# Altium footprint library ref-packages-longpad.PCBLIB: 1527 footprints (part 57 of 103)
Each footprint in its own frame and in the unit in brackets; x right, y up, seen from the top. Pads: shape width x height; smd on the part's side, far side on the other; paste and mask are expansions set on the pad; w line width, h text height; cw(c..) or ccw(c..) is an arc to the next point about the centre after c.
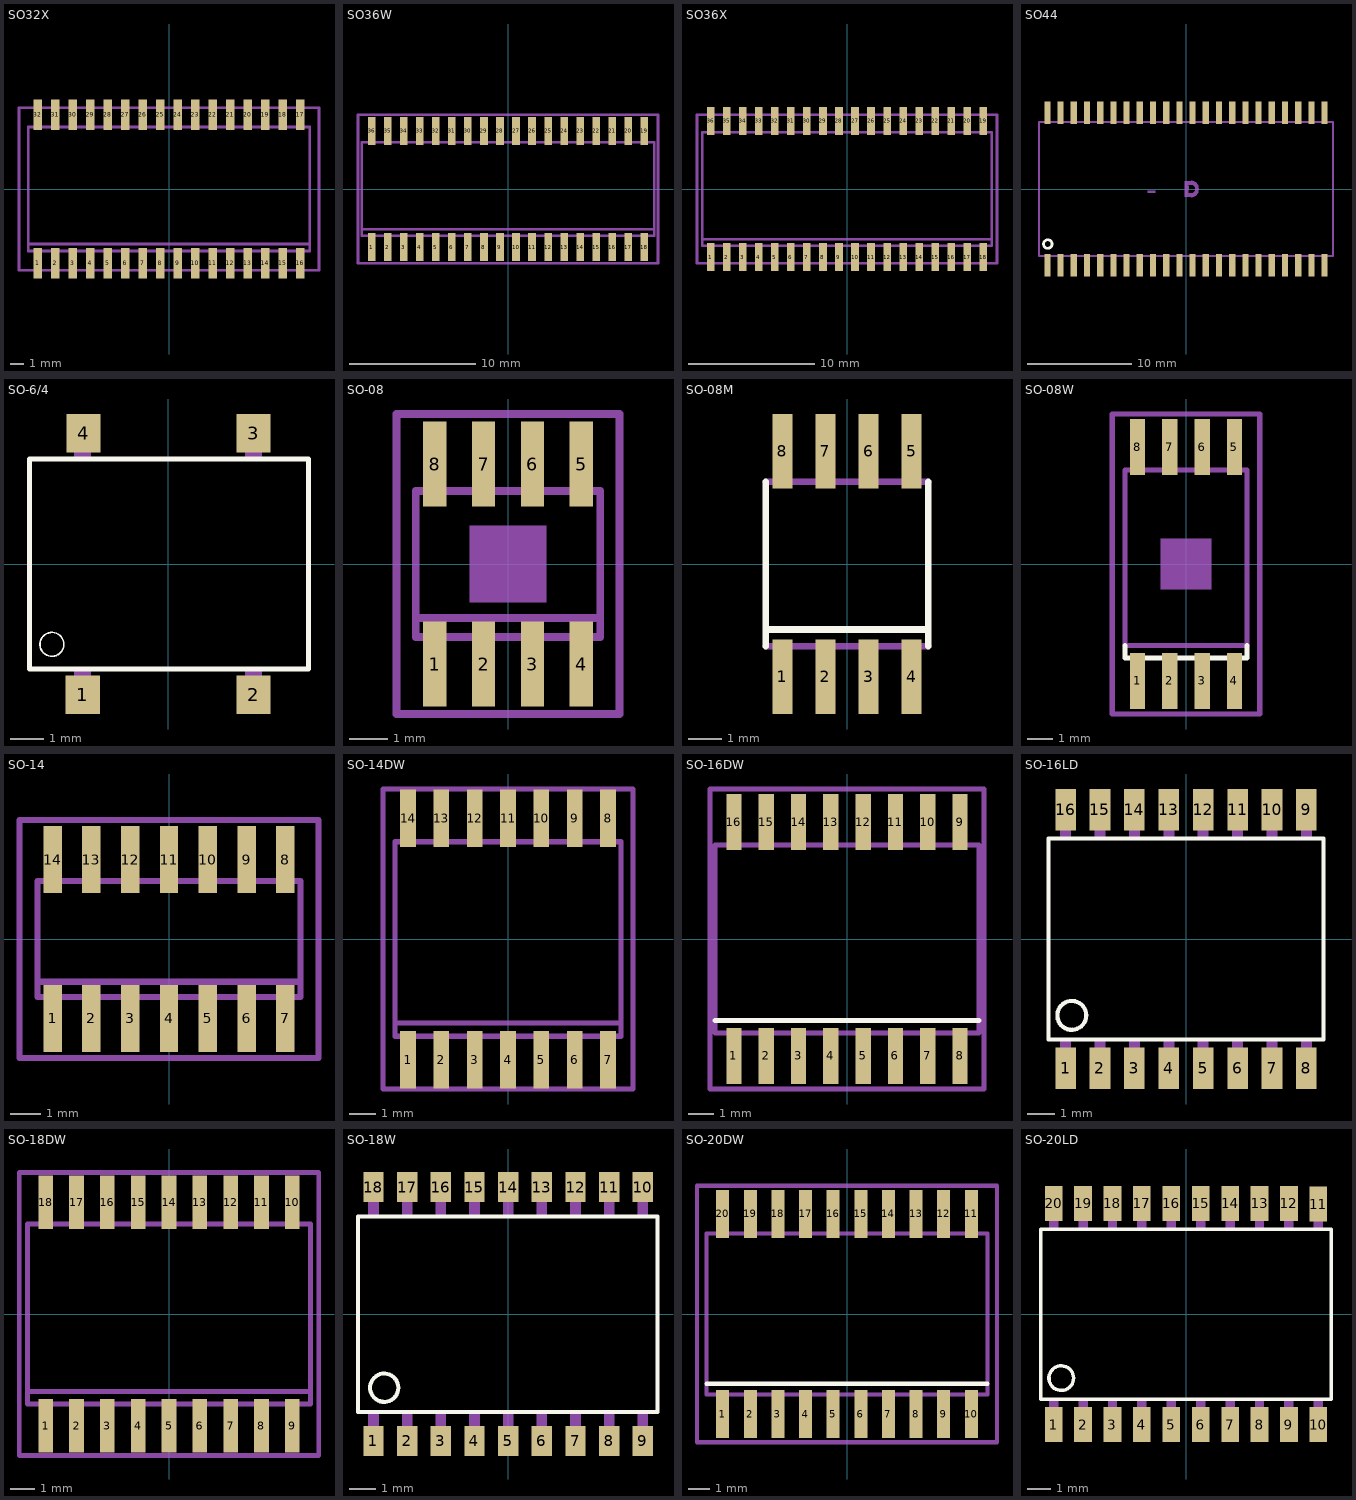
[diagram p56: the footprints below, top view; thin cyan lines are the x and y axes]

## SO32X [mil]
pads (32):
  rect 23.62x86.61 smd: 1(-375,-212.6) 2(-325,-212.6) 3(-275,-212.6) 4(-225,-212.6) 5(-175,-212.6) 6(-125,-212.6) 7(-75,-212.6) 8(-25,-212.6) 9(25,-212.6) 10(75,-212.6) 11(125,-212.6) 12(175,-212.6) 13(225,-212.6) 14(275,-212.6) 15(325,-212.6) 16(375,-212.6) 17(375,212.6) 18(325,212.6) 19(275,212.6) 20(225,212.6) 21(175,212.6) 22(125,212.6) 23(75,212.6) 24(25,212.6) 25(-25,212.6) 26(-75,212.6) 27(-125,212.6) 28(-175,212.6) 29(-225,212.6) 30(-275,212.6) 31(-325,212.6) 32(-375,212.6)
Mechanical 16:
  rectangle: -384.65,-240.94 -365.35,-181.1
  rectangle: -334.65,-240.94 -315.35,-181.1
  rectangle: -284.65,-240.94 -265.35,-181.1
  rectangle: -234.65,-240.94 -215.35,-181.1
  rectangle: -184.65,-240.94 -165.35,-181.1
  rectangle: -134.65,-240.94 -115.35,-181.1
  rectangle: -84.65,-240.94 -65.35,-181.1
  rectangle: -34.65,-240.94 -15.35,-181.1
  rectangle: 15.35,-240.94 34.65,-181.1
  rectangle: 65.35,-240.94 84.65,-181.1
  rectangle: 115.35,-240.94 134.65,-181.1
  rectangle: 165.35,-240.94 184.65,-181.1
  rectangle: 215.35,-240.94 234.65,-181.1
  rectangle: 265.35,-240.94 284.65,-181.1
  rectangle: 315.35,-240.94 334.65,-181.1
  rectangle: 365.35,-240.94 384.65,-181.1
  rectangle: 365.35,181.1 384.65,240.94
  rectangle: 315.35,181.1 334.65,240.94
  rectangle: 265.35,181.1 284.65,240.94
  rectangle: 215.35,181.1 234.65,240.94
  rectangle: 165.35,181.1 184.65,240.94
  rectangle: 115.35,181.1 134.65,240.94
  rectangle: 65.35,181.1 84.65,240.94
  rectangle: 15.35,181.1 34.65,240.94
  rectangle: -34.65,181.1 -15.35,240.94
  rectangle: -84.65,181.1 -65.35,240.94
  rectangle: -134.65,181.1 -115.35,240.94
  rectangle: -184.65,181.1 -165.35,240.94
  rectangle: -234.65,181.1 -215.35,240.94
  rectangle: -284.65,181.1 -265.35,240.94
  rectangle: -334.65,181.1 -315.35,240.94
  rectangle: -384.65,181.1 -365.35,240.94
  lines w8: -402.36,-157.48 -402.36,-177.17 402.36,-177.17 402.36,-157.48 ; -402.36,-157.48 -402.36,177.17 402.36,177.17 402.36,-157.48 ; -402.36,-157.48 402.36,-157.48
Mechanical 27:
  lines w7.87: -428.94,-232.28 428.94,-232.28 428.94,232.28 -428.94,232.28 -428.94,-232.28

## SO36W [mil]
pads (36):
  rect 23.62x86.61 smd: 1(-425,-181.1) 2(-375,-181.1) 3(-325,-181.1) 4(-275,-181.1) 5(-225,-181.1) 6(-175,-181.1) 7(-125,-181.1) 8(-75,-181.1) 9(-25,-181.1) 10(25,-181.1) 11(75,-181.1) 12(125,-181.1) 13(175,-181.1) 14(225,-181.1) 15(275,-181.1) 16(325,-181.1) 17(375,-181.1) 18(425,-181.1) 19(425,181.1) 20(375,181.1) 21(325,181.1) 22(275,181.1) 23(225,181.1) 24(175,181.1) 25(125,181.1) 26(75,181.1) 27(25,181.1) 28(-25,181.1) 29(-75,181.1) 30(-125,181.1) 31(-175,181.1) 32(-225,181.1) 33(-275,181.1) 34(-325,181.1) 35(-375,181.1) 36(-425,181.1)
Mechanical 16:
  rectangle: -434.65,-209.45 -415.35,-149.61
  rectangle: -384.65,-209.45 -365.35,-149.61
  rectangle: -334.65,-209.45 -315.35,-149.61
  rectangle: -284.65,-209.45 -265.35,-149.61
  rectangle: -234.65,-209.45 -215.35,-149.61
  rectangle: -184.65,-209.45 -165.35,-149.61
  rectangle: -134.65,-209.45 -115.35,-149.61
  rectangle: -84.65,-209.45 -65.35,-149.61
  rectangle: -34.65,-209.45 -15.35,-149.61
  rectangle: 15.35,-209.45 34.65,-149.61
  rectangle: 65.35,-209.45 84.65,-149.61
  rectangle: 115.35,-209.45 134.65,-149.61
  rectangle: 165.35,-209.45 184.65,-149.61
  rectangle: 215.35,-209.45 234.65,-149.61
  rectangle: 265.35,-209.45 284.65,-149.61
  rectangle: 315.35,-209.45 334.65,-149.61
  rectangle: 365.35,-209.45 384.65,-149.61
  rectangle: 415.35,-209.45 434.65,-149.61
  rectangle: 415.35,149.61 434.65,209.45
  rectangle: 365.35,149.61 384.65,209.45
  rectangle: 315.35,149.61 334.65,209.45
  rectangle: 265.35,149.61 284.65,209.45
  rectangle: 215.35,149.61 234.65,209.45
  rectangle: 165.35,149.61 184.65,209.45
  rectangle: 115.35,149.61 134.65,209.45
  rectangle: 65.35,149.61 84.65,209.45
  rectangle: 15.35,149.61 34.65,209.45
  rectangle: -34.65,149.61 -15.35,209.45
  rectangle: -84.65,149.61 -65.35,209.45
  rectangle: -134.65,149.61 -115.35,209.45
  rectangle: -184.65,149.61 -165.35,209.45
  rectangle: -234.65,149.61 -215.35,209.45
  rectangle: -284.65,149.61 -265.35,209.45
  rectangle: -334.65,149.61 -315.35,209.45
  rectangle: -384.65,149.61 -365.35,209.45
  rectangle: -434.65,149.61 -415.35,209.45
  lines w8: -456.3,-125.98 -456.3,-145.67 456.3,-145.67 456.3,-125.98 ; -456.3,-125.98 -456.3,145.67 456.3,145.67 456.3,-125.98 ; -456.3,-125.98 456.3,-125.98
Mechanical 27:
  lines w7.87: -468.31,-232.28 468.31,-232.28 468.31,232.28 -468.31,232.28 -468.31,-232.28

## SO36X [mil]
pads (36):
  rect 23.62x86.61 smd: 1(-425,-212.6) 2(-375,-212.6) 3(-325,-212.6) 4(-275,-212.6) 5(-225,-212.6) 6(-175,-212.6) 7(-125,-212.6) 8(-75,-212.6) 9(-25,-212.6) 10(25,-212.6) 11(75,-212.6) 12(125,-212.6) 13(175,-212.6) 14(225,-212.6) 15(275,-212.6) 16(325,-212.6) 17(375,-212.6) 18(425,-212.6) 19(425,212.6) 20(375,212.6) 21(325,212.6) 22(275,212.6) 23(225,212.6) 24(175,212.6) 25(125,212.6) 26(75,212.6) 27(25,212.6) 28(-25,212.6) 29(-75,212.6) 30(-125,212.6) 31(-175,212.6) 32(-225,212.6) 33(-275,212.6) 34(-325,212.6) 35(-375,212.6) 36(-425,212.6)
Mechanical 16:
  rectangle: -434.65,-240.94 -415.35,-181.1
  rectangle: -384.65,-240.94 -365.35,-181.1
  rectangle: -334.65,-240.94 -315.35,-181.1
  rectangle: -284.65,-240.94 -265.35,-181.1
  rectangle: -234.65,-240.94 -215.35,-181.1
  rectangle: -184.65,-240.94 -165.35,-181.1
  rectangle: -134.65,-240.94 -115.35,-181.1
  rectangle: -84.65,-240.94 -65.35,-181.1
  rectangle: -34.65,-240.94 -15.35,-181.1
  rectangle: 15.35,-240.94 34.65,-181.1
  rectangle: 65.35,-240.94 84.65,-181.1
  rectangle: 115.35,-240.94 134.65,-181.1
  rectangle: 165.35,-240.94 184.65,-181.1
  rectangle: 215.35,-240.94 234.65,-181.1
  rectangle: 265.35,-240.94 284.65,-181.1
  rectangle: 315.35,-240.94 334.65,-181.1
  rectangle: 365.35,-240.94 384.65,-181.1
  rectangle: 415.35,-240.94 434.65,-181.1
  rectangle: 415.35,181.1 434.65,240.94
  rectangle: 365.35,181.1 384.65,240.94
  rectangle: 315.35,181.1 334.65,240.94
  rectangle: 265.35,181.1 284.65,240.94
  rectangle: 215.35,181.1 234.65,240.94
  rectangle: 165.35,181.1 184.65,240.94
  rectangle: 115.35,181.1 134.65,240.94
  rectangle: 65.35,181.1 84.65,240.94
  rectangle: 15.35,181.1 34.65,240.94
  rectangle: -34.65,181.1 -15.35,240.94
  rectangle: -84.65,181.1 -65.35,240.94
  rectangle: -134.65,181.1 -115.35,240.94
  rectangle: -184.65,181.1 -165.35,240.94
  rectangle: -234.65,181.1 -215.35,240.94
  rectangle: -284.65,181.1 -265.35,240.94
  rectangle: -334.65,181.1 -315.35,240.94
  rectangle: -384.65,181.1 -365.35,240.94
  rectangle: -434.65,181.1 -415.35,240.94
  lines w8: -452.36,-157.48 -452.36,-177.17 452.36,-177.17 452.36,-157.48 ; -452.36,-157.48 -452.36,177.17 452.36,177.17 452.36,-157.48 ; -452.36,-157.48 452.36,-157.48
Mechanical 27:
  lines w7.87: -468.31,-232.28 468.31,-232.28 468.31,232.28 -468.31,232.28 -468.31,-232.28

## SO44 [mil]
pads (44):
  rect 23.62x86.61 smd: 1(-525,-288.98) 2(-475,-288.98) 3(-425,-288.98) 4(-375,-288.98) 5(-325,-288.98) 6(-275,-288.98) 7(-225,-288.98) 8(-175,-288.98) 9(-125,-288.98) 10(-75,-288.98) 11(-25,-288.98) 12(25,-288.98) 13(75,-288.98) 14(125,-288.98) 15(175,-288.98) 16(225,-288.98) 17(275,-288.98) 18(325,-288.98) 19(375,-288.98) 20(425,-288.98) 21(475,-288.98) 22(525,-288.98) 23(525,288.98) 24(475,288.98) 25(425,288.98) 26(375,288.98) 27(325,288.98) 28(275,288.98) 29(225,288.98) 30(175,288.98) 31(125,288.98) 32(75,288.98) 33(25,288.98) 34(-25,288.98) 35(-75,288.98) 36(-125,288.98) 37(-175,288.98) 38(-225,288.98) 39(-275,288.98) 40(-325,288.98) 41(-375,288.98) 42(-425,288.98) 43(-475,288.98) 44(-525,288.98)
Top Overlay:
  circle w10: c-523.62,-208.66 r16.23
Mechanical 16:
  rectangle: -534.65,-317.32 -515.35,-257.48
  rectangle: -484.65,-317.32 -465.35,-257.48
  rectangle: -434.65,-317.32 -415.35,-257.48
  rectangle: -384.65,-317.32 -365.35,-257.48
  rectangle: -334.65,-317.32 -315.35,-257.48
  rectangle: -284.65,-317.32 -265.35,-257.48
  rectangle: -234.65,-317.32 -215.35,-257.48
  rectangle: -184.65,-317.32 -165.35,-257.48
  rectangle: -134.65,-317.32 -115.35,-257.48
  rectangle: -84.65,-317.32 -65.35,-257.48
  rectangle: -34.65,-317.32 -15.35,-257.48
  rectangle: 15.35,-317.32 34.65,-257.48
  rectangle: 65.35,-317.32 84.65,-257.48
  rectangle: 115.35,-317.32 134.65,-257.48
  rectangle: 165.35,-317.32 184.65,-257.48
  rectangle: 215.35,-317.32 234.65,-257.48
  rectangle: 265.35,-317.32 284.65,-257.48
  rectangle: 315.35,-317.32 334.65,-257.48
  rectangle: 365.35,-317.32 384.65,-257.48
  rectangle: 415.35,-317.32 434.65,-257.48
  rectangle: 465.35,-317.32 484.65,-257.48
  rectangle: 515.35,-317.32 534.65,-257.48
  rectangle: 515.35,257.48 534.65,317.32
  rectangle: 465.35,257.48 484.65,317.32
  rectangle: 415.35,257.48 434.65,317.32
  rectangle: 365.35,257.48 384.65,317.32
  rectangle: 315.35,257.48 334.65,317.32
  rectangle: 265.35,257.48 284.65,317.32
  rectangle: 215.35,257.48 234.65,317.32
  rectangle: 165.35,257.48 184.65,317.32
  rectangle: 115.35,257.48 134.65,317.32
  rectangle: 65.35,257.48 84.65,317.32
  rectangle: 15.35,257.48 34.65,317.32
  rectangle: -34.65,257.48 -15.35,317.32
  rectangle: -84.65,257.48 -65.35,317.32
  rectangle: -134.65,257.48 -115.35,317.32
  rectangle: -184.65,257.48 -165.35,317.32
  rectangle: -234.65,257.48 -215.35,317.32
  rectangle: -284.65,257.48 -265.35,317.32
  rectangle: -334.65,257.48 -315.35,317.32
  rectangle: -384.65,257.48 -365.35,317.32
  rectangle: -434.65,257.48 -415.35,317.32
  rectangle: -484.65,257.48 -465.35,317.32
  rectangle: -534.65,257.48 -515.35,317.32
  rectangle: -2,16 20,30
  rectangle: -2,-30 20,-16
  rectangle: -145,-15 -115,-5
  rectangle: -5,-30 10,30
  region: 0,0 10,0 10,10 0,10
  region: 0,0 10,0 10,10 0,10
  region: 0,0 10,0 10,10 0,10
  region: 0,0 10,0 10,10 0,10
  lines w2: 19,-29 ccw(c19,0) 19,29
  lines w8: 19,-25 ccw(c19,0) 19,25 ; -556.3,-253.54 556.3,-253.54 556.3,253.54 -556.3,253.54 -556.3,-253.54
  lines w10: 19,-21 ccw(c19,0) 19,21

## SO-6/4 [mil]
pads (4):
  rect 40x45 smd: 1(-100,-153) 2(100,-153) 3(100,153) 4(-99,153)
Top Overlay:
  circle w2: c-136,-94 r14
  lines w6: -162,-123 164,-123 164,123 -162,123 -162,-123
Mechanical 16:
  rectangle: -110,-159 -90,-125
  rectangle: 90,-159 110,-125
  rectangle: 90,125 110,159
  rectangle: -110,125 -90,159

## SO-08 [mil]
pads (8):
  rect 23.62x86.61 smd: 1(-75,-102.36) 2(-25,-102.36) 3(25,-102.36) 4(75,-102.36) 5(75,102.36) 6(25,102.36) 7(-25,102.36) 8(-75,102.36)
Mechanical 6:
  rectangle: -39.37,-39.37 39.37,39.37
Mechanical 13:
  text "IPC SO8" at -75,-25 h24.8
  text "JEDEC MS-012 AA" at -75,14.37 h18.6
Mechanical 16:
  rectangle: -84.65,-122.05 -65.35,-78.74
  rectangle: -34.65,-122.05 -15.35,-78.74
  rectangle: 15.35,-122.05 34.65,-78.74
  rectangle: 65.35,-122.05 84.65,-78.74
  rectangle: 65.35,78.74 84.65,122.05
  rectangle: 15.35,78.74 34.65,122.05
  rectangle: -34.65,78.74 -15.35,122.05
  rectangle: -84.65,78.74 -65.35,122.05
  lines w8: -94.49,-55.12 -94.49,-74.8 94.49,-74.8 94.49,-55.12 ; -94.49,-55.12 -94.49,74.8 94.49,74.8 94.49,-55.12 ; -94.49,-55.12 94.49,-55.12
Mechanical 27:
  lines w7.87: -114.17,-153.54 114.17,-153.54 114.17,153.54 -114.17,153.54 -114.17,-153.54

## SO-08M [mil]
pads (8):
  rect 23.62x86.61 smd: 1(-75,-131.1) 2(-25,-131.1) 3(25,-131.1) 4(75,-131.1) 5(75,131.1) 6(25,131.1) 7(-25,131.1) 8(-75,131.1)
Top Overlay:
  rectangle: -84.65,-159.45 -65.35,-99.61
  rectangle: -34.65,-159.45 -15.35,-99.61
  rectangle: 15.35,-159.45 34.65,-99.61
  rectangle: 65.35,-159.45 84.65,-99.61
  rectangle: 65.35,99.61 84.65,159.45
  rectangle: 15.35,99.61 34.65,159.45
  rectangle: -34.65,99.61 -15.35,159.45
  rectangle: -84.65,99.61 -65.35,159.45
  lines w8: -94.49,-95.67 -94.49,-75.98 ; -94.49,95.67 -94.49,-75.98 ; 94.49,-95.67 94.49,-75.98 ; 94.49,95.67 94.49,-75.98 ; -94.49,-75.98 94.49,-75.98
Mechanical 13:
  text "SO8 Medium" at -75,-50 h18.6
  text "Microchip" at -75,-25 h18.6
Mechanical 16:
  lines w8: -94.49,-95.67 94.49,-95.67 ; -94.49,95.67 94.49,95.67

## SO-08W [mil]
pads (8):
  rect 23.62x86.61 smd: 1(-75,-181.1) 2(-25,-181.1) 3(25,-181.1) 4(75,-181.1) 5(75,181.1) 6(25,181.1) 7(-25,181.1) 8(-75,181.1)
Top Overlay:
  rectangle: -84.65,-209.45 -65.35,-149.61
  rectangle: -34.65,-209.45 -15.35,-149.61
  rectangle: 15.35,-209.45 34.65,-149.61
  rectangle: 65.35,-209.45 84.65,-149.61
  rectangle: 65.35,149.61 84.65,209.45
  rectangle: 15.35,149.61 34.65,209.45
  rectangle: -34.65,149.61 -15.35,209.45
  rectangle: -84.65,149.61 -65.35,209.45
  lines w8: -94.49,-125.98 -94.49,-145.67 94.49,-145.67 94.49,-125.98
Mechanical 6:
  rectangle: -39.37,-39.37 39.37,39.37
Mechanical 13:
  text "IPC SO8W" at 0,-100 h24.8
Mechanical 16:
  lines w8: -94.49,-125.98 -94.49,145.67 94.49,145.67 94.49,-125.98 -94.49,-125.98
Mechanical 27:
  lines w7.87: -114.17,-232.28 114.17,-232.28 114.17,232.28 -114.17,232.28 -114.17,-232.28

## SO-14 [mil]
pads (14):
  rect 23.62x86.61 smd: 1(-150,-102.36) 2(-100,-102.36) 3(-50,-102.36) 4(0,-102.36) 5(50,-102.36) 6(100,-102.36) 7(150,-102.36) 8(150,102.36) 9(100,102.36) 10(50,102.36) 11(0,102.36) 12(-50,102.36) 13(-100,102.36) 14(-150,102.36)
Mechanical 13:
  text "JEDEC MS-012 AB" at -150,14.37 h18.6
  text "IPC SO14" at -150,-25 h24.8
Mechanical 16:
  rectangle: -159.65,-122.05 -140.35,-78.74
  rectangle: -109.65,-122.05 -90.35,-78.74
  rectangle: -59.65,-122.05 -40.35,-78.74
  rectangle: -9.65,-122.05 9.65,-78.74
  rectangle: -9.65,78.74 9.65,122.05
  rectangle: -59.65,78.74 -40.35,122.05
  rectangle: -109.65,78.74 -90.35,122.05
  rectangle: -159.65,78.74 -140.35,122.05
  rectangle: 40.35,-122.05 59.65,-78.74
  rectangle: 90.35,-122.05 109.65,-78.74
  rectangle: 140.35,-122.05 159.65,-78.74
  rectangle: 140.35,78.74 159.65,122.05
  rectangle: 90.35,78.74 109.65,122.05
  rectangle: 40.35,78.74 59.65,122.05
  lines w8: -169.49,-55.12 -169.49,-74.8 169.49,-74.8 169.49,-55.12 ; -169.49,-55.12 -169.49,74.8 169.49,74.8 169.49,-55.12 ; -169.49,-55.12 169.49,-55.12
Mechanical 27:
  lines w7.87: -192.72,-153.54 192.72,-153.54 192.72,153.54 -192.72,153.54 -192.72,-153.54

## SO-14DW [mil]
pads (14):
  rect 23.62x86.61 smd: 1(-150,-181.1) 2(-100,-181.1) 3(-50,-181.1) 4(0,-181.1) 5(50,-181.1) 6(100,-181.1) 7(150,-181.1) 8(150,181.1) 9(100,181.1) 10(50,181.1) 11(0,181.1) 12(-50,181.1) 13(-100,181.1) 14(-150,181.1)
Mechanical 16:
  rectangle: -159.65,-209.45 -140.35,-149.61
  rectangle: -109.65,-209.45 -90.35,-149.61
  rectangle: -59.65,-209.45 -40.35,-149.61
  rectangle: -9.65,-209.45 9.65,-149.61
  rectangle: 40.35,-209.45 59.65,-149.61
  rectangle: 90.35,-209.45 109.65,-149.61
  rectangle: 140.35,-209.45 159.65,-149.61
  rectangle: 140.35,149.61 159.65,209.45
  rectangle: 90.35,149.61 109.65,209.45
  rectangle: 40.35,149.61 59.65,209.45
  rectangle: -9.65,149.61 9.65,209.45
  rectangle: -59.65,149.61 -40.35,209.45
  rectangle: -109.65,149.61 -90.35,209.45
  rectangle: -159.65,149.61 -140.35,209.45
  lines w8: -169.49,-125.98 -169.49,-145.67 169.49,-145.67 169.49,-125.98 ; -169.49,-125.98 -169.49,145.67 169.49,145.67 169.49,-125.98 ; -169.49,-125.98 169.49,-125.98
Mechanical 27:
  lines w7.87: -187.5,-225 -187.5,225 187.5,225 187.5,-225 -187.5,-225

## SO-16DW [mil]
pads (16):
  rect 23.62x86.61 smd: 1(-175,-181.1) 2(-125,-181.1) 3(-75,-181.1) 4(-25,-181.1) 5(25,-181.1) 6(75,-181.1) 7(125,-181.1) 8(175,-181.1) 9(175,181.1) 10(125,181.1) 11(75,181.1) 12(25,181.1) 13(-25,181.1) 14(-75,181.1) 15(-125,181.1) 16(-175,181.1)
Top Overlay:
  lines w8: -204.33,-125.98 204.33,-125.98
Mechanical 16:
  rectangle: -184.65,-209.45 -165.35,-149.61
  rectangle: -134.65,-209.45 -115.35,-149.61
  rectangle: -84.65,-209.45 -65.35,-149.61
  rectangle: -34.65,-209.45 -15.35,-149.61
  rectangle: 15.35,-209.45 34.65,-149.61
  rectangle: 65.35,-209.45 84.65,-149.61
  rectangle: 115.35,-209.45 134.65,-149.61
  rectangle: 165.35,-209.45 184.65,-149.61
  rectangle: 165.35,149.61 184.65,209.45
  rectangle: 115.35,149.61 134.65,209.45
  rectangle: 65.35,149.61 84.65,209.45
  rectangle: 15.35,149.61 34.65,209.45
  rectangle: -34.65,149.61 -15.35,209.45
  rectangle: -84.65,149.61 -65.35,209.45
  rectangle: -134.65,149.61 -115.35,209.45
  rectangle: -184.65,149.61 -165.35,209.45
  lines w8: -204.33,-145.67 204.33,-145.67 204.33,145.67 -204.33,145.67 -204.33,-145.67
Mechanical 27:
  lines w7.87: -212.4,-232.28 212.4,-232.28 212.4,232.28 -212.4,232.28 -212.4,-232.28

## SO-16LD [mil]
pads (16):
  rect 30x60 smd: 1(-175,-188) 2(-125,-188) 3(-75,-188) 4(-25,-188) 5(25,-188) 6(75,-188) 7(125,-188) 8(175,-188) 9(175,188) 10(125,188) 11(75,188) 12(25,188) 13(-25,188) 14(-75,188) 15(-125,188) 16(-175,188)
Top Overlay:
  circle w6: c-166,-111 r21
  lines w6: -200,-146 200,-146 200,146 -200,146 -200,-146
Mechanical 16:
  rectangle: 167,148 183,200
  rectangle: 117,148 133,200
  rectangle: 67,148 83,200
  rectangle: 17,148 33,200
  rectangle: -33,148 -17,200
  rectangle: -83,148 -67,200
  rectangle: -133,148 -117,200
  rectangle: -183,148 -167,200
  rectangle: 167,-200 183,-148
  rectangle: 117,-200 133,-148
  rectangle: 67,-200 83,-148
  rectangle: 17,-200 33,-148
  rectangle: -33,-200 -17,-148
  rectangle: -83,-200 -67,-148
  rectangle: -133,-200 -117,-148
  rectangle: -183,-200 -167,-148

## SO-18DW [mil]
pads (18):
  rect 23.62x86.61 smd: 1(-200,-181.1) 2(-150,-181.1) 3(-100,-181.1) 4(-50,-181.1) 5(0,-181.1) 6(50,-181.1) 7(100,-181.1) 8(150,-181.1) 9(200,-181.1) 10(200,181.1) 11(150,181.1) 12(100,181.1) 13(50,181.1) 14(0,181.1) 15(-50,181.1) 16(-100,181.1) 17(-150,181.1) 18(-200,181.1)
Mechanical 16:
  rectangle: -209.65,-209.45 -190.35,-149.61
  rectangle: -159.65,-209.45 -140.35,-149.61
  rectangle: -109.65,-209.45 -90.35,-149.61
  rectangle: -59.65,-209.45 -40.35,-149.61
  rectangle: -9.65,-209.45 9.65,-149.61
  rectangle: 40.35,-209.45 59.65,-149.61
  rectangle: 90.35,-209.45 109.65,-149.61
  rectangle: 140.35,-209.45 159.65,-149.61
  rectangle: 190.35,-209.45 209.65,-149.61
  rectangle: 190.35,149.61 209.65,209.45
  rectangle: 140.35,149.61 159.65,209.45
  rectangle: 90.35,149.61 109.65,209.45
  rectangle: 40.35,149.61 59.65,209.45
  rectangle: -9.65,149.61 9.65,209.45
  rectangle: -59.65,149.61 -40.35,209.45
  rectangle: -109.65,149.61 -90.35,209.45
  rectangle: -159.65,149.61 -140.35,209.45
  rectangle: -209.65,149.61 -190.35,209.45
  lines w8: -229.33,-125.98 -229.33,-145.67 229.33,-145.67 229.33,-125.98 ; -229.33,-125.98 -229.33,145.67 229.33,145.67 229.33,-125.98 ; -229.33,-125.98 229.33,-125.98
Mechanical 27:
  lines w7.87: -242.99,-229.49 -242.99,229.49 243,229.5 242.99,-229.49 -242.99,-229.49

## SO-18W [mil]
pads (18):
  rect 30x45 smd: 1(-200,-188.5) 2(-150,-188.5) 3(-100,-188.5) 4(-50,-188.5) 5(0,-188.5) 6(50,-188.5) 7(100,-188.5) 8(150,-188.5) 9(200,-188.5) 10(200,188.5) 11(150,188.5) 12(100,188.5) 13(50,188.5) 14(0,188.5) 15(-50,188.5) 16(-100,188.5) 17(-150,188.5) 18(-200,188.5)
Top Overlay:
  circle w6: c-184,-109.5 r21
  lines w6: -223,-145.5 222,-145.5 222,144.5 -223,144.5 -223,-145.5
Mechanical 16:
  rectangle: 192,146.5 208,199.5
  rectangle: 142,146.5 158,199.5
  rectangle: 92,146.5 108,199.5
  rectangle: 42,146.5 58,199.5
  rectangle: -8,146.5 8,199.5
  rectangle: -58,146.5 -42,199.5
  rectangle: -108,146.5 -92,199.5
  rectangle: -158,146.5 -142,199.5
  rectangle: -208,146.5 -192,199.5
  rectangle: -208,-200.5 -192,-147.5
  rectangle: -158,-200.5 -142,-147.5
  rectangle: -108,-200.5 -92,-147.5
  rectangle: -58,-200.5 -42,-147.5
  rectangle: -8,-200.5 8,-147.5
  rectangle: 42,-200.5 58,-147.5
  rectangle: 92,-200.5 108,-147.5
  rectangle: 142,-200.5 158,-147.5
  rectangle: 192,-200.5 208,-147.5

## SO-20DW [mil]
pads (20):
  rect 23.62x86.61 smd: 1(-225,-181.1) 2(-175,-181.1) 3(-125,-181.1) 4(-75,-181.1) 5(-25,-181.1) 6(25,-181.1) 7(75,-181.1) 8(125,-181.1) 9(175,-181.1) 10(225,-181.1) 11(225,181.1) 12(175,181.1) 13(125,181.1) 14(75,181.1) 15(25,181.1) 16(-25,181.1) 17(-75,181.1) 18(-125,181.1) 19(-175,181.1) 20(-225,181.1)
Top Overlay:
  lines w8: -254.33,-125.98 254.33,-125.98
Mechanical 16:
  rectangle: -234.65,-209.45 -215.35,-149.61
  rectangle: -184.65,-209.45 -165.35,-149.61
  rectangle: -134.65,-209.45 -115.35,-149.61
  rectangle: -84.65,-209.45 -65.35,-149.61
  rectangle: -34.65,-209.45 -15.35,-149.61
  rectangle: 15.35,-209.45 34.65,-149.61
  rectangle: 65.35,-209.45 84.65,-149.61
  rectangle: 115.35,-209.45 134.65,-149.61
  rectangle: 165.35,-209.45 184.65,-149.61
  rectangle: 215.35,-209.45 234.65,-149.61
  rectangle: 215.35,149.61 234.65,209.45
  rectangle: 165.35,149.61 184.65,209.45
  rectangle: 115.35,149.61 134.65,209.45
  rectangle: 65.35,149.61 84.65,209.45
  rectangle: 15.35,149.61 34.65,209.45
  rectangle: -34.65,149.61 -15.35,209.45
  rectangle: -84.65,149.61 -65.35,209.45
  rectangle: -134.65,149.61 -115.35,209.45
  rectangle: -184.65,149.61 -165.35,209.45
  rectangle: -234.65,149.61 -215.35,209.45
  lines w8: -254.33,-145.67 254.33,-145.67 254.33,145.67 -254.33,145.67 -254.33,-145.67
Mechanical 27:
  lines w7.87: -271.46,-232.28 271.46,-232.28 271.46,232.28 -271.46,232.28 -271.46,-232.28

## SO-20LD [mil]
pads (20):
  rect 30x60 smd: 1(-225,-188) 2(-175,-188) 3(-125,-188) 4(-75,-188) 5(-25,-188) 6(25,-188) 7(75,-188) 8(125,-188) 9(175,-188) 10(225,-188) 11(225,187) 12(175,188) 13(125,188) 14(75,188) 15(25,188) 16(-25,188) 17(-75,188) 18(-125,188) 19(-175,188) 20(-225,188)
Top Overlay:
  circle w6: c-212,-109 r21
  lines w6: -247,-145 247,-145 247,144 -247,144 -247,-145
Mechanical 16:
  rectangle: 217,146 233,198
  rectangle: 167,146 183,198
  rectangle: 117,146 133,198
  rectangle: 67,146 83,198
  rectangle: 17,146 33,198
  rectangle: -33,146 -17,198
  rectangle: -83,146 -67,198
  rectangle: -133,146 -117,198
  rectangle: -183,146 -167,198
  rectangle: -233,146 -217,198
  rectangle: 217,-199 233,-147
  rectangle: 167,-199 183,-147
  rectangle: 117,-199 133,-147
  rectangle: 67,-199 83,-147
  rectangle: 17,-199 33,-147
  rectangle: -33,-199 -17,-147
  rectangle: -83,-199 -67,-147
  rectangle: -133,-199 -117,-147
  rectangle: -183,-199 -167,-147
  rectangle: -233,-199 -217,-147